# Altium footprint library Lib_Global (1).PcbLib: 60 footprints (part 3 of 4)
Each footprint in its own frame and in the unit in brackets; x right, y up, seen from the top. Pads: shape width x height; smd on the part's side, far side on the other; paste and mask are expansions set on the pad; w line width, h text height; cw(c..) or ccw(c..) is an arc to the next point about the centre after c.
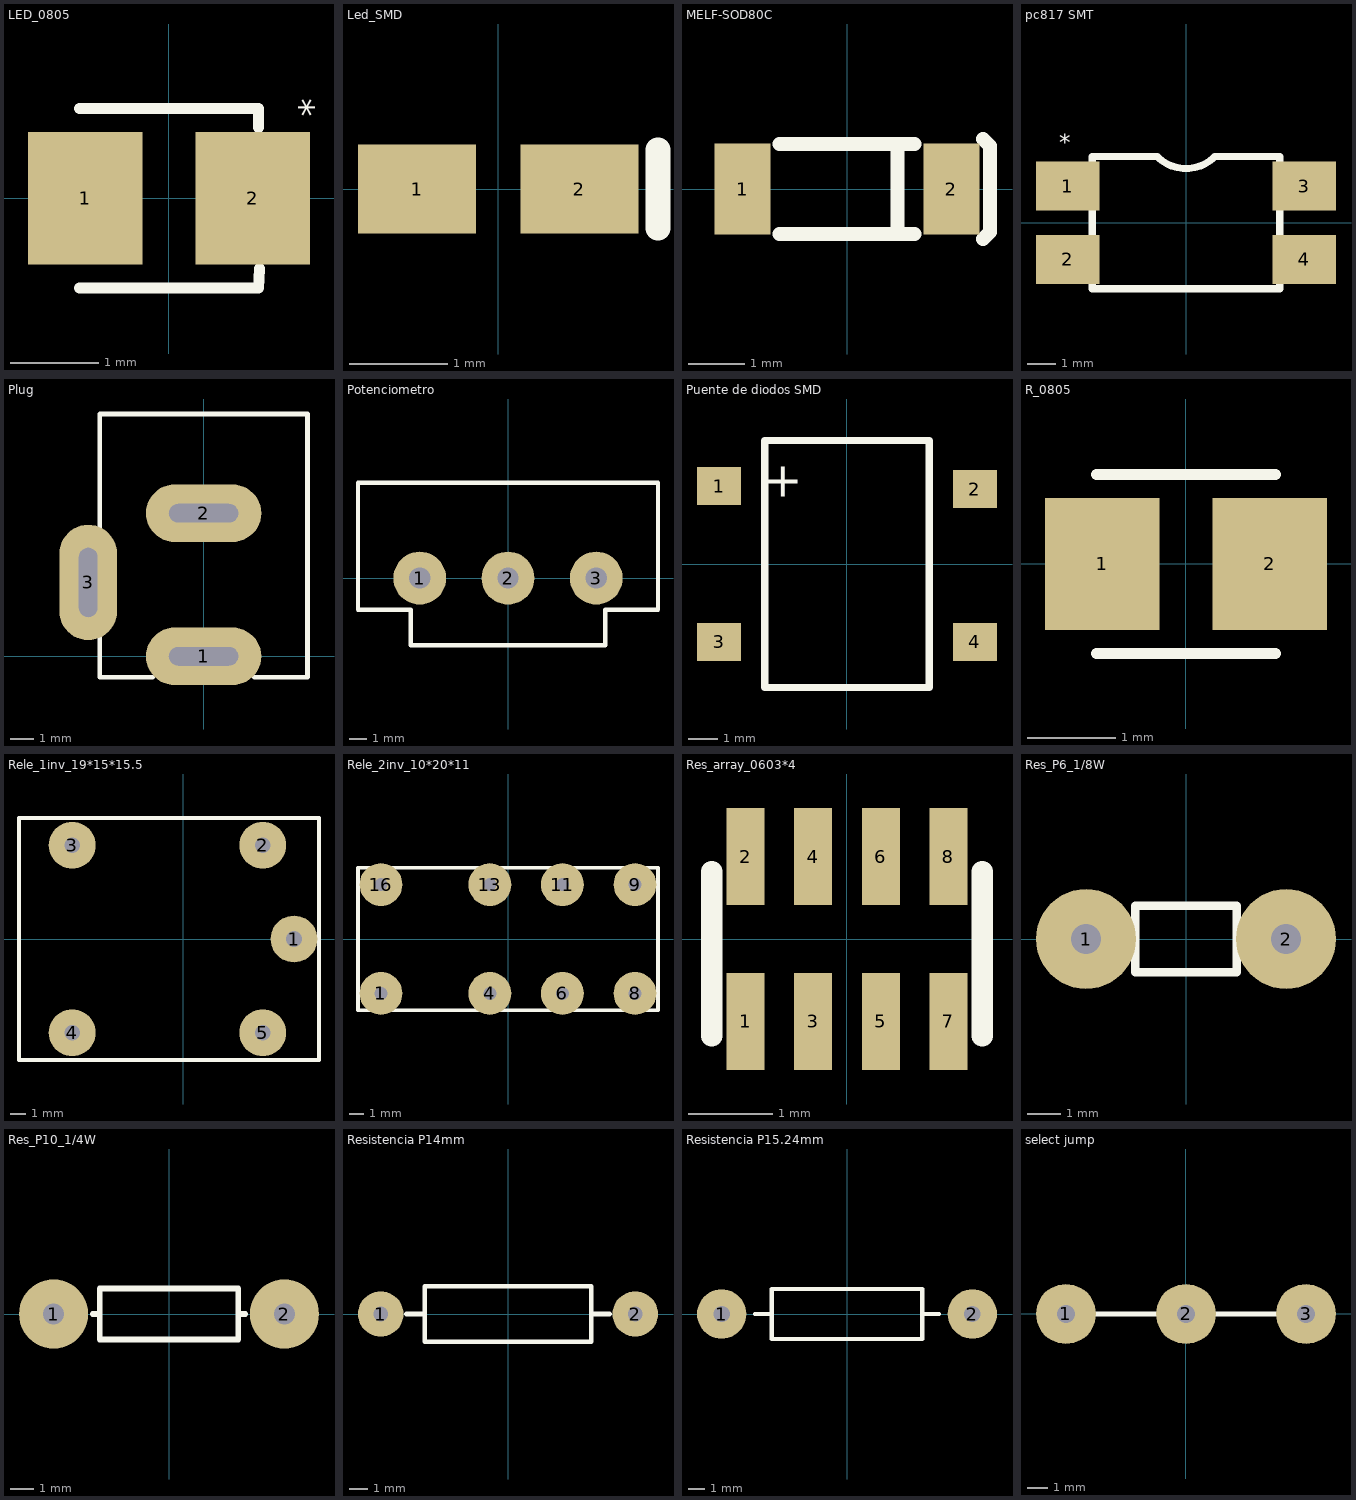
[diagram p2: the footprints below, top view; thin cyan lines are the x and y axes]

## LED_0805 [mm]
pads (2):
  rect 1.3x1.5 smd: 1(-0.95,0) 2(0.95,0)
Top Overlay:
  lines w0.127: -1.016,-1.016 1.016,-1.016 1.025,-0.8 ; -1.016,1.016 1.016,1.016 1.016,0.8
  text "*" at 1.35,0.925 h0.3
3D body "everlight-17-21-0805LED-GREEN.SLDPRT": height 1.1, standoff -0.01, extent -1,-0.625 1,0.625

## Led_SMD [mm]
pads (2):
  rect 1.2x0.9 smd: 1(-0.825,0) 2(0.825,0)
Top Overlay:
  lines w0.25: 1.625,-0.4 1.625,0.4

## MELF-SOD80C [mm]
pads (2):
  rect 1x1.62 smd mask+0.5: 1(-1.855,0) 2(1.855,0)
Top Overlay:
  lines w0.25: -1.2,-0.8 1.2,-0.8 ; -1.2,0.8 1.2,0.8 ; 0.9,-0.8 0.9,0.8 ; 2.413,-0.889 2.54,-0.762 2.54,0.762 2.413,0.889
3D body "User Library-melf-2.sldprt": height 1.6, standoff 0.01, extent -1.855,-0.798 1.845,0.798

## pc817 SMT [mm]
pads (4):
  rect 2.2x1.7 smd: 1(-4.1,1.27) 2(-4.1,-1.27) 3(4.1,1.27) 4(4.1,-1.27)
Top Overlay:
  lines w0.25: -3.25,-2.29 3.25,-2.29 3.25,2.29 1,2.29 cw(c0,3.29) -1,2.29 -3.25,2.29 -3.25,-2.29
  text "*" at -4,2.29 h1

## Plug [mm]
pads (3):
  oval 5x2.5 hole 3 slot 0.8 at 90 deg: 1(0,0) 2(0,6.2)
  oval 2.5x5 hole 0.8 slot 3 at 90 deg: 3(-5,3.2)
Top Overlay:
  lines w0.2: -4.5,1 -4.5,-0.9 -2.2,-0.9 ; -4.5,5.4 -4.5,10.5 4.5,10.5 4.5,-0.9 2.2,-0.9
Mechanical 1:
3D body "User Library-3066-31000001R-Rev_01.sldprt": height 10.7, standoff -3.9, extent -5.05,0 4.5,14.5
3D body: height 0.25, standoff 0, extent 0.725,5.85 0.725,5.85

## Potenciometro [mm]
pads (3):
  round 3 hole 1.2: 1(-5,0) 2(0,0) 3(5,0)
Top Overlay:
  lines w0.25: -8.5,-1.8 -5.5,-1.8 -5.5,-3.8 5.5,-3.8 5.5,-1.8 8.5,-1.8 8.5,5.4 -8.5,5.4 -8.5,-1.8
3D body "User Library-TrimPot.sldprt": height 21.3, standoff -3.9, extent -8.5,-18.425 8.499,5.775

## Puente de diodos SMD [mm]
pads (4):
  rect 1.5x1.3 smd: 1(-4.35,2.65) 2(4.35,2.55) 3(-4.35,-2.65) 4(4.35,-2.65)
Top Overlay:
  lines w0.25: -2.8,-4.2 2.8,-4.2 2.8,4.2 -2.8,4.2 -2.8,-4.2
  text "+" at -1.5,1.9 h2

## R_0805 [mm]
pads (2):
  rect 1.3x1.5 smd: 1(-0.95,0) 2(0.95,0)
Top Overlay:
  lines w0.127: -1.016,-1.016 1.016,-1.016 ; -1.016,1.016 1.016,1.016
3D body "User Library-RES_2013-0805.sldprt": height 0.76, standoff 0, extent -1.15,-0.675 1.15,0.675
3D body: height 0.25, standoff 0, extent 1.8,-1.2 1.8,-1.2

## Rele_1inv_19*15*15.5 [mm]
pads (5):
  round 3 hole 1: 1(7.1,0) 2(5.1,6) 3(-7.1,6) 4(-7.1,-6) 5(5.1,-6)
Top Overlay:
  lines w0.254: -10.5,-7.75 -10.5,7.75 8.7,7.75 8.7,-7.75 -10.5,-7.75
3D body "User Library-relay_songle_Relay SPDT Songle.sldprt": height 15.3, standoff -5, extent -10.65,-7.75 8.45,7.75

## Rele_2inv_10*20*11 [mm]
pads (8):
  round 3 hole 0.9: 1(-8.89,-3.81) 4(-1.27,-3.81) 6(3.81,-3.81) 8(8.89,-3.81) 9(8.89,3.81) 11(3.81,3.81) 13(-1.27,3.81) 16(-8.89,3.81)
Top Overlay:
  lines w0.25: -10.5,-5 -10.5,5 10.5,5 10.5,-5 -10.5,-5
3D body: height 1, standoff -1, extent -4.09,0.59 -4.09,0.59
3D body "User Library-rly_dpdt_20x9_8x12mm.sldprt": height 12.05, standoff -3.5, extent -10,-4.9 10,4.9

## Res_array_0603*4 [mm]
pads (8):
  rect 0.45x1.15 smd: 1(-1.2,-0.975) 2(-1.2,0.975) 3(-0.4,-0.975) 4(-0.4,0.975) 5(0.4,-0.975) 6(0.4,0.975) 7(1.2,-0.975) 8(1.2,0.975)
Top Overlay:
  lines w0.25: -1.6,-1.15 -1.6,0.8 ; 1.6,-1.15 1.6,0.8

## Res_P6_1/8W [mm]
pads (2):
  round 3 hole 0.9: 1(-3,0) 2(3,0)
Top Overlay:
  lines w0.25: -1.824,0 -1.524,0 ; 1.524,0 1.905,0 ; -1.524,-1 -1.524,1 1.524,1 1.524,-1 -1.524,-1
3D body "User Library-Res_1-8w_1_2.sldprt": height 1.9, standoff -2, extent -3.2,-0.889 3.2,0.911

## Res_P10_1/4W [mm]
pads (2):
  round 3 hole 0.9: 1(-5,0) 2(5,0)
Top Overlay:
  lines w0.25: -3.3,0 -3,0 ; 3,0 3.3,0 ; -3,-1.1 3,-1.1 3,1.1 -3,1.1 -3,-1.1
3D body "User Library-1_4 Watt.sldprt": height 2.18, standoff -3.9, extent -5.335,-1.083 5.334,1.085

## Resistencia P14mm [mm]
pads (2):
  round 2.5 hole 0.8 mask+0.5: 1(-7,0) 2(7,0)
Top Overlay:
  lines w0.25: -5.588,0 -4.572,0 ; 4.572,0 5.588,0 ; -4.572,-1.524 -4.572,1.524 4.572,1.524 4.572,-1.524 -4.572,-1.524

## Resistencia P15.24mm [mm]
pads (2):
  round 3 hole 1: 1(-7.62,0) 2(7.62,0)
Top Overlay:
  lines w0.25: -5.588,0 -4.572,0 ; 4.572,0 5.588,0 ; -4.572,-1.524 -4.572,1.524 4.572,1.524 4.572,-1.524 -4.572,-1.524
3D body "User Library-PR02.sldprt": height 3.95, standoff -8.43, extent -8,-1.947 8.04,1.947

## select jump [mm]
pads (3):
  round 3 hole 0.9: 1(-6,0) 2(0,0) 3(6,0)
Top Overlay:
  lines w0.25: -6,0 6,0